# Altium footprint library ICs And Semiconductors SMD.PcbLib: 943 footprints (part 31 of 60)
Each footprint in its own frame and in the unit in brackets; x right, y up, seen from the top. Pads: shape width x height; smd on the part's side, far side on the other; paste and mask are expansions set on the pad; w line width, h text height; cw(c..) or ccw(c..) is an arc to the next point about the centre after c.
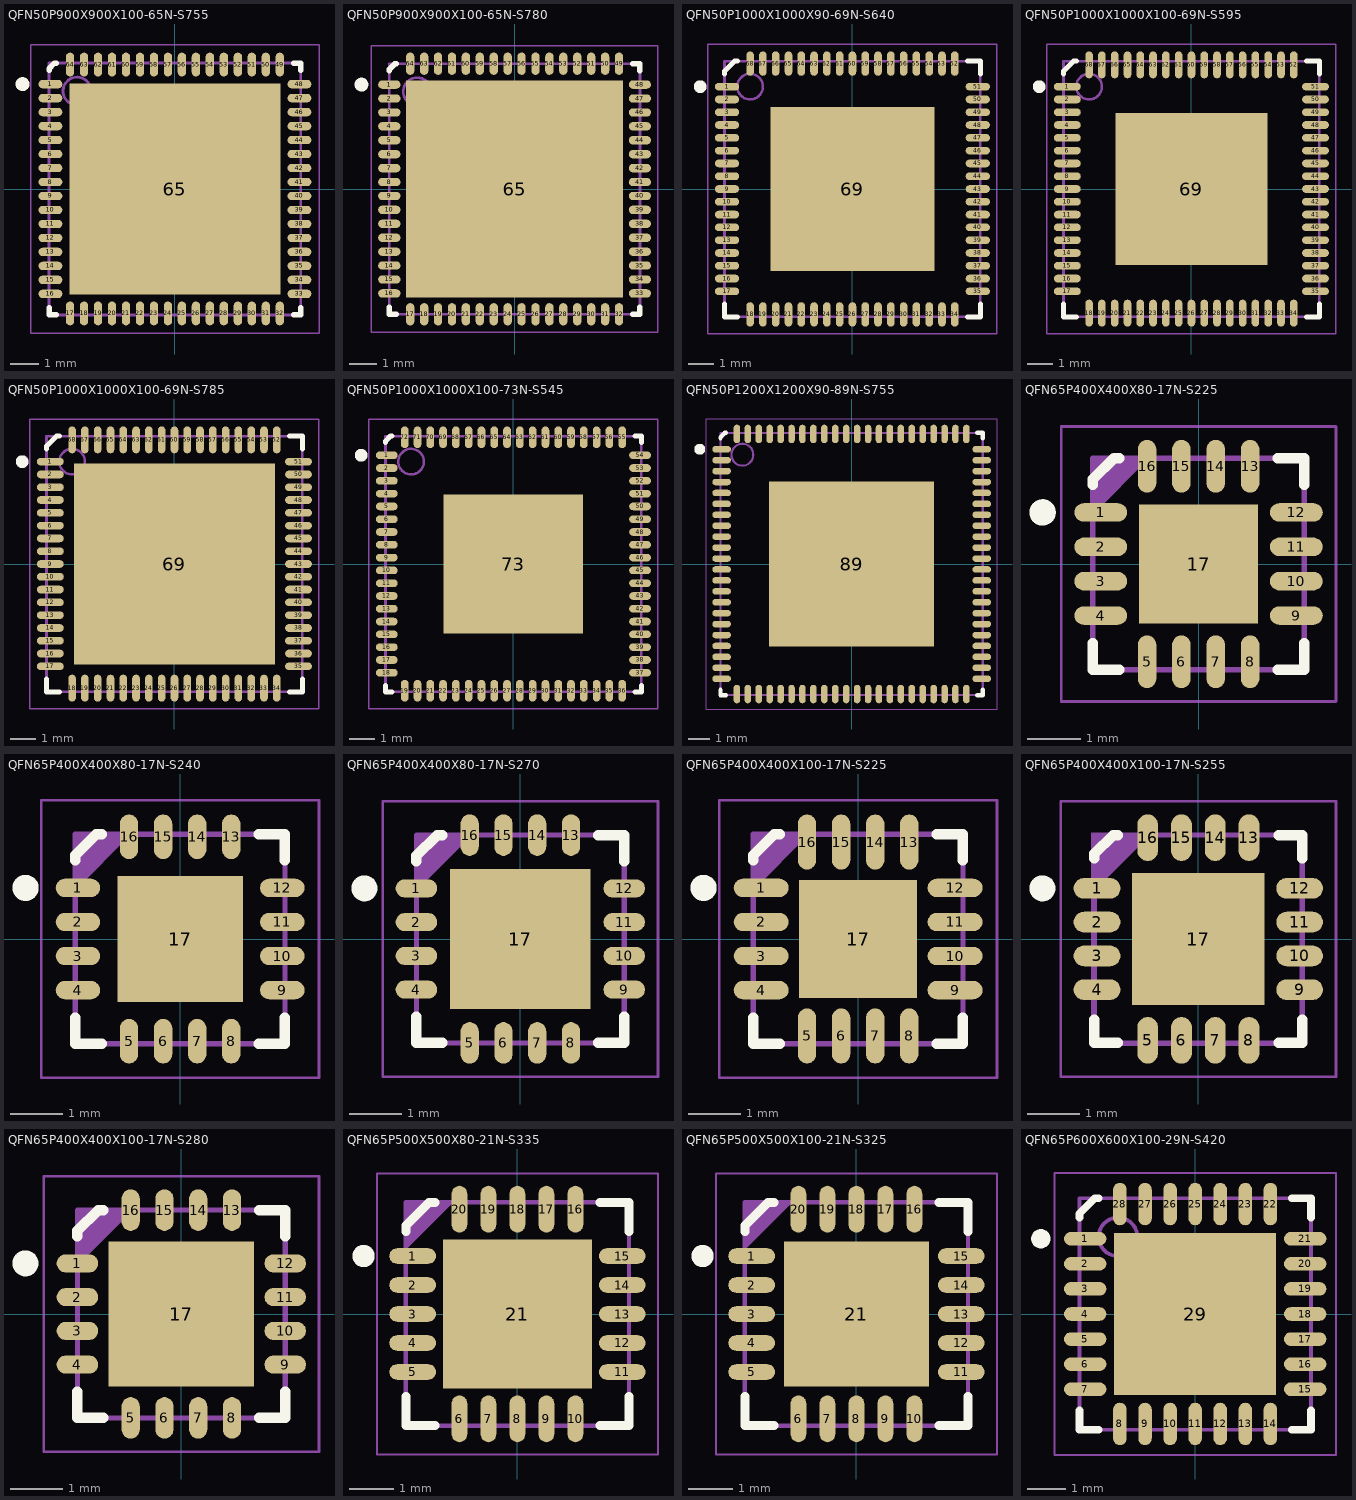
[diagram p30: the footprints below, top view; thin cyan lines are the x and y axes]

## QFN50P900X900X100-65N-S755 [mm] "QFN, 0.50mm Pitch, Square; 64 Pin, 9.00mm L X 9.00mm W X 1.00mm H Body (7.55 X 7.55mm Thermal Tab), IPC Medium Density"
height 1
pads (65):
  oval 0.85x0.3 smd: 1(-4.45,3.75) 2(-4.45,3.25) 3(-4.45,2.75) 4(-4.45,2.25) 5(-4.45,1.75) 6(-4.45,1.25) 7(-4.45,0.75) 8(-4.45,0.25) 9(-4.45,-0.25) 10(-4.45,-0.75) 11(-4.45,-1.25) 12(-4.45,-1.75) 13(-4.45,-2.25) 14(-4.45,-2.75) 15(-4.45,-3.25) 16(-4.45,-3.75) 33(4.45,-3.75) 34(4.45,-3.25) 35(4.45,-2.75) 36(4.45,-2.25) 37(4.45,-1.75) 38(4.45,-1.25) 39(4.45,-0.75) 40(4.45,-0.25) 41(4.45,0.25) 42(4.45,0.75) 43(4.45,1.25) 44(4.45,1.75) 45(4.45,2.25) 46(4.45,2.75) 47(4.45,3.25) 48(4.45,3.75)
  oval 0.3x0.85 smd: 17(-3.75,-4.45) 18(-3.25,-4.45) 19(-2.75,-4.45) 20(-2.25,-4.45) 21(-1.75,-4.45) 22(-1.25,-4.45) 23(-0.75,-4.45) 24(-0.25,-4.45) 25(0.25,-4.45) 26(0.75,-4.45) 27(1.25,-4.45) 28(1.75,-4.45) 29(2.25,-4.45) 30(2.75,-4.45) 31(3.25,-4.45) 32(3.75,-4.45) 49(3.75,4.45) 50(3.25,4.45) 51(2.75,4.45) 52(2.25,4.45) 53(1.75,4.45) 54(1.25,4.45) 55(0.75,4.45) 56(0.25,4.45) 57(-0.25,4.45) 58(-0.75,4.45) 59(-1.25,4.45) 60(-1.75,4.45) 61(-2.25,4.45) 62(-2.75,4.45) 63(-3.25,4.45) 64(-3.75,4.45)
  rect 7.55x7.55 smd: 65(0,0)
Top Overlay:
  circle w0.25: c-5.45,3.75 r0.125
  lines w0.2: -4.5,-4.25 -4.5,-4.5 -4.25,-4.5 ; -4.5,4.25 -4.5,4.3 -4.3,4.5 -4.25,4.5 ; 4.25,-4.5 4.5,-4.5 4.5,-4.25 ; 4.25,4.5 4.5,4.5 4.5,4.25
Top Paste:
  region: 1.5,1.5 1.5,3.1 3.1,3.1 3.1,1.5
  region: -0.8,1.5 -0.8,3.1 0.8,3.1 0.8,1.5
  region: -3.1,1.5 -3.1,3.1 -1.5,3.1 -1.5,1.5
  region: 1.5,-0.8 1.5,0.8 3.1,0.8 3.1,-0.8
  region: -0.8,-0.8 -0.8,0.8 0.8,0.8 0.8,-0.8
  region: -3.1,-0.8 -3.1,0.8 -1.5,0.8 -1.5,-0.8
  region: 1.5,-3.1 1.5,-1.5 3.1,-1.5 3.1,-3.1
  region: -0.8,-3.1 -0.8,-1.5 0.8,-1.5 0.8,-3.1
  region: -3.1,-3.1 -3.1,-1.5 -1.5,-1.5 -1.5,-3.1
Mechanical 14:
  circle w0.1: c-3.5,3.5 r0.5
  lines w0.1: -4.5,-4.5 4.5,-4.5 4.5,4.5 -4.5,4.5 -4.5,-4.5
Mechanical 15:
  circle w0.05: c0,0 r0.35
  lines w0.05: -0.5,0 0.5,0 ; 0,-0.5 0,0.5 ; -5.15,-5.15 5.15,-5.15 5.15,5.15 -5.15,5.15 -5.15,-5.15
3D body "QFN50P900X900X100-65N-S755.stp": height 1, standoff 0, extent -4.5,-4.5 4.5,4.5

## QFN50P900X900X100-65N-S780 [mm] "QFN, 0.50mm Pitch, Square; 64 Pin, 9.00mm L X 9.00mm W X 1.00mm H Body (7.8 X 7.8mm Thermal Tab), IPC Medium Density"
height 1
pads (65):
  oval 0.8x0.3 smd: 1(-4.5,3.75) 2(-4.5,3.25) 3(-4.5,2.75) 4(-4.5,2.25) 5(-4.5,1.75) 6(-4.5,1.25) 7(-4.5,0.75) 8(-4.5,0.25) 9(-4.5,-0.25) 10(-4.5,-0.75) 11(-4.5,-1.25) 12(-4.5,-1.75) 13(-4.5,-2.25) 14(-4.5,-2.75) 15(-4.5,-3.25) 16(-4.5,-3.75) 33(4.5,-3.75) 34(4.5,-3.25) 35(4.5,-2.75) 36(4.5,-2.25) 37(4.5,-1.75) 38(4.5,-1.25) 39(4.5,-0.75) 40(4.5,-0.25) 41(4.5,0.25) 42(4.5,0.75) 43(4.5,1.25) 44(4.5,1.75) 45(4.5,2.25) 46(4.5,2.75) 47(4.5,3.25) 48(4.5,3.75)
  oval 0.3x0.8 smd: 17(-3.75,-4.5) 18(-3.25,-4.5) 19(-2.75,-4.5) 20(-2.25,-4.5) 21(-1.75,-4.5) 22(-1.25,-4.5) 23(-0.75,-4.5) 24(-0.25,-4.5) 25(0.25,-4.5) 26(0.75,-4.5) 27(1.25,-4.5) 28(1.75,-4.5) 29(2.25,-4.5) 30(2.75,-4.5) 31(3.25,-4.5) 32(3.75,-4.5) 49(3.75,4.5) 50(3.25,4.5) 51(2.75,4.5) 52(2.25,4.5) 53(1.75,4.5) 54(1.25,4.5) 55(0.75,4.5) 56(0.25,4.5) 57(-0.25,4.5) 58(-0.75,4.5) 59(-1.25,4.5) 60(-1.75,4.5) 61(-2.25,4.5) 62(-2.75,4.5) 63(-3.25,4.5) 64(-3.75,4.5)
  rect 7.8x7.8 smd: 65(0,0)
Top Overlay:
  circle w0.25: c-5.5,3.75 r0.125
  lines w0.2: -4.5,-4.25 -4.5,-4.5 -4.25,-4.5 ; -4.5,4.25 -4.5,4.3 -4.3,4.5 -4.25,4.5 ; 4.25,-4.5 4.5,-4.5 4.5,-4.25 ; 4.25,4.5 4.5,4.5 4.5,4.25
Top Paste:
  region: -3.18,-3.18 -3.18,-1.54 -1.54,-1.54 -1.54,-3.18
  region: -0.82,-3.18 -0.82,-1.54 0.82,-1.54 0.82,-3.18
  region: 1.54,-3.18 1.54,-1.54 3.18,-1.54 3.18,-3.18
  region: -3.18,-0.82 -3.18,0.82 -1.54,0.82 -1.54,-0.82
  region: -0.82,-0.82 -0.82,0.82 0.82,0.82 0.82,-0.82
  region: 1.54,-0.82 1.54,0.82 3.18,0.82 3.18,-0.82
  region: -3.18,1.54 -3.18,3.18 -1.54,3.18 -1.54,1.54
  region: -0.82,1.54 -0.82,3.18 0.82,3.18 0.82,1.54
  region: 1.54,1.54 1.54,3.18 3.18,3.18 3.18,1.54
Mechanical 14:
  circle w0.1: c-3.5,3.5 r0.5
  lines w0.1: -4.5,-4.5 -4.5,4.5 4.5,4.5 4.5,-4.5 -4.5,-4.5
Mechanical 15:
  circle w0.05: c0,0 r0.35
  lines w0.05: -0.5,0 0.5,0 ; 0,-0.5 0,0.5 ; -5.15,-5.15 -5.15,5.15 5.15,5.15 5.15,-5.15 -5.15,-5.15
3D body "QFN50P900X900X100-65N-S780.stp": height 1, standoff 0, extent -4.5,-4.5 4.5,4.5

## QFN50P1000X1000X90-69N-S640 [mm] "QFP, 0.50mm Pitch, Square; 17 pin X 17 Pin, 10.00mm X 10.00mm (W/Thermal Tab 6.4mm X 6.4mm), IPC Medium Density"
height 0.9
pads (69):
  oval 0.95x0.3 smd: 1(-4.9,4) 2(-4.9,3.5) 3(-4.9,3) 4(-4.9,2.5) 5(-4.9,2) 6(-4.9,1.5) 7(-4.9,1) 8(-4.9,0.5) 9(-4.9,0) 10(-4.9,-0.5) 11(-4.9,-1) 12(-4.9,-1.5) 13(-4.9,-2) 14(-4.9,-2.5) 15(-4.9,-3) 16(-4.9,-3.5) 17(-4.9,-4) 35(4.9,-4) 36(4.9,-3.5) 37(4.9,-3) 38(4.9,-2.5) 39(4.9,-2) 40(4.9,-1.5) 41(4.9,-1) 42(4.9,-0.5) 43(4.9,0) 44(4.9,0.5) 45(4.9,1) 46(4.9,1.5) 47(4.9,2) 48(4.9,2.5) 49(4.9,3) 50(4.9,3.5) 51(4.9,4)
  oval 0.3x0.95 smd: 18(-4,-4.9) 19(-3.5,-4.9) 20(-3,-4.9) 21(-2.5,-4.9) 22(-2,-4.9) 23(-1.5,-4.9) 24(-1,-4.9) 25(-0.5,-4.9) 26(0,-4.9) 27(0.5,-4.9) 28(1,-4.9) 29(1.5,-4.9) 30(2,-4.9) 31(2.5,-4.9) 32(3,-4.9) 33(3.5,-4.9) 34(4,-4.9) 52(4,4.9) 53(3.5,4.9) 54(3,4.9) 55(2.5,4.9) 56(2,4.9) 57(1.5,4.9) 58(1,4.9) 59(0.5,4.9) 60(0,4.9) 61(-0.5,4.9) 62(-1,4.9) 63(-1.5,4.9) 64(-2,4.9) 65(-2.5,4.9) 66(-3,4.9) 67(-3.5,4.9) 68(-4,4.9)
  rect 6.4x6.4 smd: 69(0,0)
Top Overlay:
  circle w0.25: c-5.95,4 r0.125
  lines w0.2: -5,-4.5 -5,-5 -4.5,-5 ; -5,4.5 -5,4.6 -4.6,5 -4.5,5 ; 4.5,-5 5,-5 5,-4.5 ; 4.5,5 5,5 5,4.5
Top Paste:
  region: 0.39,0.39 0.39,2.41 2.41,2.41 2.41,0.39
  region: -2.41,0.39 -2.41,2.41 -0.39,2.41 -0.39,0.39
  region: 0.39,-2.41 0.39,-0.39 2.41,-0.39 2.41,-2.41
  region: -2.41,-2.41 -2.41,-0.39 -0.39,-0.39 -0.39,-2.41
Top Solder:
  circle w0.05: c0,0 r0.35
  lines w0.05: -0.5,0 0.5,0 ; 0,-0.5 0,0.5
Mechanical 14:
  circle w0.1: c-4,4 r0.5
  lines w0.1: -5,-5 5,-5 5,5 -5,5 -5,-5
Mechanical 15:
  lines w0.05: -5.65,-5.65 5.65,-5.65 5.65,5.65 -5.65,5.65 -5.65,-5.65
3D body "QFN50P1000X1000X90-69N-S640.stp": height 0.9, standoff 0, extent -5,-5 5,5

## QFN50P1000X1000X100-69N-S595 [mm] "QFP, 0.50mm Pitch, Square; 17 pin X 17 Pin, 10.00mm X 10.00mm (W/Thermal Tab 5.95mm X 5.95mm), IPC Medium Density"
height 1
pads (69):
  oval 1.05x0.3 smd: 1(-4.85,4) 2(-4.85,3.5) 3(-4.85,3) 4(-4.85,2.5) 5(-4.85,2) 6(-4.85,1.5) 7(-4.85,1) 8(-4.85,0.5) 9(-4.85,0) 10(-4.85,-0.5) 11(-4.85,-1) 12(-4.85,-1.5) 13(-4.85,-2) 14(-4.85,-2.5) 15(-4.85,-3) 16(-4.85,-3.5) 17(-4.85,-4) 35(4.85,-4) 36(4.85,-3.5) 37(4.85,-3) 38(4.85,-2.5) 39(4.85,-2) 40(4.85,-1.5) 41(4.85,-1) 42(4.85,-0.5) 43(4.85,0) 44(4.85,0.5) 45(4.85,1) 46(4.85,1.5) 47(4.85,2) 48(4.85,2.5) 49(4.85,3) 50(4.85,3.5) 51(4.85,4)
  oval 0.3x1.05 smd: 18(-4,-4.85) 19(-3.5,-4.85) 20(-3,-4.85) 21(-2.5,-4.85) 22(-2,-4.85) 23(-1.5,-4.85) 24(-1,-4.85) 25(-0.5,-4.85) 26(0,-4.85) 27(0.5,-4.85) 28(1,-4.85) 29(1.5,-4.85) 30(2,-4.85) 31(2.5,-4.85) 32(3,-4.85) 33(3.5,-4.85) 34(4,-4.85) 52(4,4.85) 53(3.5,4.85) 54(3,4.85) 55(2.5,4.85) 56(2,4.85) 57(1.5,4.85) 58(1,4.85) 59(0.5,4.85) 60(0,4.85) 61(-0.5,4.85) 62(-1,4.85) 63(-1.5,4.85) 64(-2,4.85) 65(-2.5,4.85) 66(-3,4.85) 67(-3.5,4.85) 68(-4,4.85)
  rect 5.95x5.95 smd: 69(0,0)
Top Overlay:
  circle w0.25: c-5.95,4 r0.125
  lines w0.2: -5,-4.5 -5,-5 -4.5,-5 ; -5,4.5 -5,4.6 -4.6,5 -4.5,5 ; 4.5,-5 5,-5 5,-4.5 ; 4.5,5 5,5 5,4.5
Top Paste:
  region: 0.36,0.36 0.36,2.24 2.24,2.24 2.24,0.36
  region: -2.24,0.36 -2.24,2.24 -0.36,2.24 -0.36,0.36
  region: 0.36,-2.24 0.36,-0.36 2.24,-0.36 2.24,-2.24
  region: -2.24,-2.24 -2.24,-0.36 -0.36,-0.36 -0.36,-2.24
Mechanical 14:
  circle w0.1: c-4,4 r0.5
  lines w0.1: -5,-5 -5,5 5,5 5,-5 -5,-5
Mechanical 15:
  lines w0.05: -5.65,-5.65 -5.65,5.65 5.65,5.65 5.65,-5.65 -5.65,-5.65
3D body "QFN50P1000X1000X100-69N-S595.stp": height 1, standoff 0, extent -5.05,-5.05 5.05,5.05

## QFN50P1000X1000X100-69N-S785 [mm] "QFP, 0.50mm pitch, square; 17 pin X 17 pin, 10.00mm X 10.00mm, IPC Medium Density"
height 1
pads (69):
  oval 1.05x0.3 smd: 1(-4.85,4) 2(-4.85,3.5) 3(-4.85,3) 4(-4.85,2.5) 5(-4.85,2) 6(-4.85,1.5) 7(-4.85,1) 8(-4.85,0.5) 9(-4.85,0) 10(-4.85,-0.5) 11(-4.85,-1) 12(-4.85,-1.5) 13(-4.85,-2) 14(-4.85,-2.5) 15(-4.85,-3) 16(-4.85,-3.5) 17(-4.85,-4) 35(4.85,-4) 36(4.85,-3.5) 37(4.85,-3) 38(4.85,-2.5) 39(4.85,-2) 40(4.85,-1.5) 41(4.85,-1) 42(4.85,-0.5) 43(4.85,0) 44(4.85,0.5) 45(4.85,1) 46(4.85,1.5) 47(4.85,2) 48(4.85,2.5) 49(4.85,3) 50(4.85,3.5) 51(4.85,4)
  oval 0.3x1.05 smd: 18(-4,-4.85) 19(-3.5,-4.85) 20(-3,-4.85) 21(-2.5,-4.85) 22(-2,-4.85) 23(-1.5,-4.85) 24(-1,-4.85) 25(-0.5,-4.85) 26(0,-4.85) 27(0.5,-4.85) 28(1,-4.85) 29(1.5,-4.85) 30(2,-4.85) 31(2.5,-4.85) 32(3,-4.85) 33(3.5,-4.85) 34(4,-4.85) 52(4,4.85) 53(3.5,4.85) 54(3,4.85) 55(2.5,4.85) 56(2,4.85) 57(1.5,4.85) 58(1,4.85) 59(0.5,4.85) 60(0,4.85) 61(-0.5,4.85) 62(-1,4.85) 63(-1.5,4.85) 64(-2,4.85) 65(-2.5,4.85) 66(-3,4.85) 67(-3.5,4.85) 68(-4,4.85)
  rect 7.85x7.85 smd: 69(0,0)
Top Overlay:
  circle w0.25: c-5.95,4 r0.125
  lines w0.2: -5,-4.5 -5,-5 -4.5,-5 ; -5,4.5 -5,4.6 -4.6,5 -4.5,5 ; 4.5,-5 5,-5 5,-4.5 ; 4.5,5 5,5 5,4.5
Top Paste:
  region: -3.21,-3.21 -3.21,-1.55 -1.55,-1.55 -1.55,-3.21
  region: -0.83,-3.21 -0.83,-1.55 0.83,-1.55 0.83,-3.21
  region: 1.55,-3.21 1.55,-1.55 3.21,-1.55 3.21,-3.21
  region: -3.21,-0.83 -3.21,0.83 -1.55,0.83 -1.55,-0.83
  region: -0.83,-0.83 -0.83,0.83 0.83,0.83 0.83,-0.83
  region: 1.55,-0.83 1.55,0.83 3.21,0.83 3.21,-0.83
  region: -3.21,1.55 -3.21,3.21 -1.55,3.21 -1.55,1.55
  region: -0.83,1.55 -0.83,3.21 0.83,3.21 0.83,1.55
  region: 1.55,1.55 1.55,3.21 3.21,3.21 3.21,1.55
Mechanical 14:
  circle w0.1: c-4,4 r0.5
  lines w0.1: -5,-5 -5,5 5,5 5,-5 -5,-5
Mechanical 15:
  lines w0.05: -0.5,0 0.5,0 ; 0,-0.5 0,0.5 ; -5.65,-5.65 -5.65,5.65 5.65,5.65 5.65,-5.65 -5.65,-5.65
3D body "QFN50P1000X1000X100-69N-S785.stp": height 1, standoff 0, extent -5.05,-5.05 5.05,5.05

## QFN50P1000X1000X100-73N-S545 [mm] "QFN,0.50mm Pitch, Square;72 Pin,10.00mm L X 10.00mm W X 1.00mm H Body (W/Thermal Tab 5.45mm X 5.45mm), IPC Medium Density"
height 1
pads (73):
  oval 0.85x0.3 smd: 1(-4.95,4.25) 2(-4.95,3.75) 3(-4.95,3.25) 4(-4.95,2.75) 5(-4.95,2.25) 6(-4.95,1.75) 7(-4.95,1.25) 8(-4.95,0.75) 9(-4.95,0.25) 10(-4.95,-0.25) 11(-4.95,-0.75) 12(-4.95,-1.25) 13(-4.95,-1.75) 14(-4.95,-2.25) 15(-4.95,-2.75) 16(-4.95,-3.25) 17(-4.95,-3.75) 18(-4.95,-4.25) 37(4.95,-4.25) 38(4.95,-3.75) 39(4.95,-3.25) 40(4.95,-2.75) 41(4.95,-2.25) 42(4.95,-1.75) 43(4.95,-1.25) 44(4.95,-0.75) 45(4.95,-0.25) 46(4.95,0.25) 47(4.95,0.75) 48(4.95,1.25) 49(4.95,1.75) 50(4.95,2.25) 51(4.95,2.75) 52(4.95,3.25) 53(4.95,3.75) 54(4.95,4.25)
  oval 0.3x0.85 smd: 19(-4.25,-4.95) 20(-3.75,-4.95) 21(-3.25,-4.95) 22(-2.75,-4.95) 23(-2.25,-4.95) 24(-1.75,-4.95) 25(-1.25,-4.95) 26(-0.75,-4.95) 27(-0.25,-4.95) 28(0.25,-4.95) 29(0.75,-4.95) 30(1.25,-4.95) 31(1.75,-4.95) 32(2.25,-4.95) 33(2.75,-4.95) 34(3.25,-4.95) 35(3.75,-4.95) 36(4.25,-4.95) 55(4.25,4.95) 56(3.75,4.95) 57(3.25,4.95) 58(2.75,4.95) 59(2.25,4.95) 60(1.75,4.95) 61(1.25,4.95) 62(0.75,4.95) 63(0.25,4.95) 64(-0.25,4.95) 65(-0.75,4.95) 66(-1.25,4.95) 67(-1.75,4.95) 68(-2.25,4.95) 69(-2.75,4.95) 70(-3.25,4.95) 71(-3.75,4.95) 72(-4.25,4.95)
  rect 5.45x5.45 smd: 73(0,0)
Top Overlay:
  circle w0.25: c-5.95,4.25 r0.125
  lines w0.2: -5,-4.75 -5,-5 -4.75,-5 ; -5,4.75 -5,4.8 -4.8,5 -4.75,5 ; 4.75,-5 5,-5 5,-4.75 ; 4.75,5 5,5 5,4.75
Top Paste:
  region: 0.33,0.33 0.33,2.05 2.05,2.05 2.05,0.33
  region: -2.05,0.33 -2.05,2.05 -0.33,2.05 -0.33,0.33
  region: 0.33,-2.05 0.33,-0.33 2.05,-0.33 2.05,-2.05
  region: -2.05,-2.05 -2.05,-0.33 -0.33,-0.33 -0.33,-2.05
Mechanical 14:
  circle w0.1: c-4,4 r0.5
  lines w0.1: -5,-5 5,-5 5,5 -5,5 -5,-5
Mechanical 15:
  lines w0.05: -5.65,-5.65 5.65,-5.65 5.65,5.65 -5.65,5.65 -5.65,-5.65
3D body "QFN50P1000X1000X100-73N-S545.stp": height 1, standoff -0.03, extent -5,-5 5,5

## QFN50P1200X1200X90-89N-S755 [mm] "QFN, 0.50mm pitch, square; 22 pin X 22 pin, 12.00mm X 12.00mm, IPC Medium Density"
height 0.9
pads (89):
  oval 0.85x0.3 smd: 1(-5.95,5.25) 2(-5.95,4.75) 3(-5.95,4.25) 4(-5.95,3.75) 5(-5.95,3.25) 6(-5.95,2.75) 7(-5.95,2.25) 8(-5.95,1.75) 9(-5.95,1.25) 10(-5.95,0.75) 11(-5.95,0.25) 12(-5.95,-0.25) 13(-5.95,-0.75) 14(-5.95,-1.25) 15(-5.95,-1.75) 16(-5.95,-2.25) 17(-5.95,-2.75) 18(-5.95,-3.25) 19(-5.95,-3.75) 20(-5.95,-4.25) 21(-5.95,-4.75) 22(-5.95,-5.25) 45(5.95,-5.25) 46(5.95,-4.75) 47(5.95,-4.25) 48(5.95,-3.75) 49(5.95,-3.25) 50(5.95,-2.75) 51(5.95,-2.25) 52(5.95,-1.75) 53(5.95,-1.25) 54(5.95,-0.75) 55(5.95,-0.25) 56(5.95,0.25) 57(5.95,0.75) 58(5.95,1.25) 59(5.95,1.75) 60(5.95,2.25) 61(5.95,2.75) 62(5.95,3.25) 63(5.95,3.75) 64(5.95,4.25) 65(5.95,4.75) 66(5.95,5.25)
  oval 0.3x0.85 smd: 23(-5.25,-5.95) 24(-4.75,-5.95) 25(-4.25,-5.95) 26(-3.75,-5.95) 27(-3.25,-5.95) 28(-2.75,-5.95) 29(-2.25,-5.95) 30(-1.75,-5.95) 31(-1.25,-5.95) 32(-0.75,-5.95) 33(-0.25,-5.95) 34(0.25,-5.95) 35(0.75,-5.95) 36(1.25,-5.95) 37(1.75,-5.95) 38(2.25,-5.95) 39(2.75,-5.95) 40(3.25,-5.95) 41(3.75,-5.95) 42(4.25,-5.95) 43(4.75,-5.95) 44(5.25,-5.95) 67(5.25,5.95) 68(4.75,5.95) 69(4.25,5.95) 70(3.75,5.95) 71(3.25,5.95) 72(2.75,5.95) 73(2.25,5.95) 74(1.75,5.95) 75(1.25,5.95) 76(0.75,5.95) 77(0.25,5.95) 78(-0.25,5.95) 79(-0.75,5.95) 80(-1.25,5.95) 81(-1.75,5.95) 82(-2.25,5.95) 83(-2.75,5.95) 84(-3.25,5.95) 85(-3.75,5.95) 86(-4.25,5.95) 87(-4.75,5.95) 88(-5.25,5.95)
  rect 7.55x7.55 smd: 89(0,0)
Top Overlay:
  circle w0.25: c-6.95,5.25 r0.125
  lines w0.2: -6,-5.75 -6,-6 -5.75,-6 ; -6,5.75 -6,5.8 -5.8,6 -5.75,6 ; 5.75,-6 6,-6 6,-5.75 ; 5.75,6 6,6 6,5.75
Top Paste:
  region: 1.5,1.5 1.5,3.1 3.1,3.1 3.1,1.5
  region: -0.8,1.5 -0.8,3.1 0.8,3.1 0.8,1.5
  region: -3.1,1.5 -3.1,3.1 -1.5,3.1 -1.5,1.5
  region: 1.5,-0.8 1.5,0.8 3.1,0.8 3.1,-0.8
  region: -0.8,-0.8 -0.8,0.8 0.8,0.8 0.8,-0.8
  region: -3.1,-0.8 -3.1,0.8 -1.5,0.8 -1.5,-0.8
  region: 1.5,-3.1 1.5,-1.5 3.1,-1.5 3.1,-3.1
  region: -0.8,-3.1 -0.8,-1.5 0.8,-1.5 0.8,-3.1
  region: -3.1,-3.1 -3.1,-1.5 -1.5,-1.5 -1.5,-3.1
Top Solder:
  circle w0.05: c0,0 r0.35
  lines w0.05: -0.5,0 0.5,0 ; 0,-0.5 0,0.5
Mechanical 14:
  circle w0.1: c-5,5 r0.5
  lines w0.1: -6,-6 6,-6 6,6 -6,6 -6,-6
Mechanical 15:
  circle w0.05: c0,0 r0.35
  lines w0.05: -0.5,0 0.5,0 ; 0,-0.5 0,0.5 ; -6.65,-6.65 6.65,-6.65 6.65,6.65 -6.65,6.65 -6.65,-6.65
3D body "QFN50P1200X1200X90-89N-S755.stp": height 0.9, standoff 0, extent -6.05,-6.05 6.05,6.05

## QFN65P400X400X80-17N-S225 [mm] "QFN, 0.65mm Pitch, Square; 16 Pin, 4.00mm L X 4.00mm W X 0.80mm H Body (w/Thermal tab 2.25 X 2.25mm),  IPC Medium Density"
height 0.8
pads (17):
  oval 1x0.35 smd: 1(-1.85,0.975) 2(-1.85,0.325) 3(-1.85,-0.325) 4(-1.85,-0.975) 9(1.85,-0.975) 10(1.85,-0.325) 11(1.85,0.325) 12(1.85,0.975)
  oval 0.35x1 smd: 5(-0.975,-1.85) 6(-0.325,-1.85) 7(0.325,-1.85) 8(0.975,-1.85) 13(0.975,1.85) 14(0.325,1.85) 15(-0.325,1.85) 16(-0.975,1.85)
  rect 2.25x2.25 smd: 17(0,0)
Top Overlay:
  circle w0.25: c-2.95,0.975 r0.125
  lines w0.2: -2,-1.5 -2,-2 -1.5,-2 ; -2,1.5 -2,1.6 -1.6,2 -1.5,2 ; 1.5,-2 2,-2 2,-1.5 ; 1.5,2 2,2 2,1.5
Mechanical 14:
  lines w0.1: -2,1 -1,2 ; -2,1.1 -1.1,2 ; -2,1.2 -1.2,2 ; -2,1.3 -1.3,2 ; -2,1.4 -1.4,2 ; -2,1.5 -1.5,2 ; -2,1.6 -1.6,2 ; -2,1.7 -1.7,2 ; -2,1.8 -1.8,2 ; -2,1.9 -1.9,2 ; -2,-2 -2,2 2,2 2,-2 -2,-2
Mechanical 15:
  circle w0.05: c0,0 r0.35
  lines w0.05: -0.5,0 0.5,0 ; 0,-0.5 0,0.5 ; -2.6,-2.6 -2.6,2.6 2.6,2.6 2.6,-2.6 -2.6,-2.6
3D body "QFN65P400X400X80-17N-S225.stp": height 0.8, standoff 0, extent -2,-2 2,2

## QFN65P400X400X80-17N-S240 [mm] "QFN, 0.65mm Pitch, Square; 16 Pin, 4.00mm L X 4.00mm W X 0.80mm H Body (w/Thermal tab 2.4 X 2.4mm),  IPC Medium Density"
height 0.8
pads (17):
  rrect100% 0.85x0.35 smd: 1(-1.95,0.975) 2(-1.95,0.325) 3(-1.95,-0.325) 4(-1.95,-0.975) 9(1.95,-0.975) 10(1.95,-0.325) 11(1.95,0.325) 12(1.95,0.975)
  rrect100% 0.35x0.85 smd: 5(-0.975,-1.95) 6(-0.325,-1.95) 7(0.325,-1.95) 8(0.975,-1.95) 13(0.975,1.95) 14(0.325,1.95) 15(-0.325,1.95) 16(-0.975,1.95)
  rect 2.4x2.4 smd: 17(0,0)
Top Overlay:
  circle w0.25: c-2.95,0.975 r0.125
  lines w0.2: -2,-1.5 -2,-2 -1.5,-2 ; -2,1.5 -2,1.6 -1.6,2 -1.5,2 ; 1.5,-2 2,-2 2,-1.5 ; 1.5,2 2,2 2,1.5
Mechanical 14:
  lines w0.1: -2,1 -1,2 ; -2,1.1 -1.1,2 ; -2,1.2 -1.2,2 ; -2,1.3 -1.3,2 ; -2,1.4 -1.4,2 ; -2,1.5 -1.5,2 ; -2,1.6 -1.6,2 ; -2,1.7 -1.7,2 ; -2,1.8 -1.8,2 ; -2,1.9 -1.9,2 ; -2,-2 2,-2 2,2 -2,2 -2,-2
Mechanical 15:
  circle w0.05: c0,0 r0.35
  lines w0.05: -0.5,0 0.5,0 ; 0,-0.5 0,0.5 ; -2.65,-2.65 2.65,-2.65 2.65,2.65 -2.65,2.65 -2.65,-2.65
3D body "QFN65P400X400X80-17N-S240.stp": height 0.8, standoff 0, extent -2,-2 2,2

## QFN65P400X400X80-17N-S270 [mm] "QFN, 0.65mm Pitch, Square; 16 Pin, 4.00mm L X 4.00mm W X 0.80mm H Body (w/thermal tab 2.7 X 2.7mm),  IPC Medium Density"
height 0.8
pads (17):
  oval 0.8x0.35 smd: 1(-2,0.975) 2(-2,0.325) 3(-2,-0.325) 4(-2,-0.975) 9(2,-0.975) 10(2,-0.325) 11(2,0.325) 12(2,0.975)
  oval 0.35x0.8 smd: 5(-0.975,-2) 6(-0.325,-2) 7(0.325,-2) 8(0.975,-2) 13(0.975,2) 14(0.325,2) 15(-0.325,2) 16(-0.975,2)
  rect 2.7x2.7 smd: 17(0,0)
Top Overlay:
  circle w0.25: c-3,0.975 r0.125
  lines w0.2: -2,-1.5 -2,-2 -1.5,-2 ; -2,1.5 -2,1.6 -1.6,2 -1.5,2 ; 1.5,-2 2,-2 2,-1.5 ; 1.5,2 2,2 2,1.5
Mechanical 14:
  lines w0.1: -2,1 -1,2 ; -2,1.1 -1.1,2 ; -2,1.2 -1.2,2 ; -2,1.3 -1.3,2 ; -2,1.4 -1.4,2 ; -2,1.5 -1.5,2 ; -2,1.6 -1.6,2 ; -2,1.7 -1.7,2 ; -2,1.8 -1.8,2 ; -2,1.9 -1.9,2 ; -2,-2 2,-2 2,2 -2,2 -2,-2
Mechanical 15:
  circle w0.05: c0,0 r0.35
  lines w0.05: -0.5,0 0.5,0 ; 0,-0.5 0,0.5 ; -2.65,-2.65 2.65,-2.65 2.65,2.65 -2.65,2.65 -2.65,-2.65
3D body "QFN65P400X400X80-17N-S270.stp": height 0.8, standoff 0, extent -2,-2 2,2

## QFN65P400X400X100-17N-S225 [mm] "QFN, 0.65mm pitch,square; 4 pin X 4 pin, 4mm X 4mm X 1mm H body (w/thermal tab 2.25 X 2.25mm),  IPC Medium Density"
height 1
pads (17):
  oval 1.05x0.35 smd: 1(-1.85,0.975) 2(-1.85,0.325) 3(-1.85,-0.325) 4(-1.85,-0.975) 9(1.85,-0.975) 10(1.85,-0.325) 11(1.85,0.325) 12(1.85,0.975)
  oval 0.35x1.05 smd: 5(-0.975,-1.85) 6(-0.325,-1.85) 7(0.325,-1.85) 8(0.975,-1.85) 13(0.975,1.85) 14(0.325,1.85) 15(-0.325,1.85) 16(-0.975,1.85)
  rect 2.25x2.25 smd: 17(0,0)
Top Overlay:
  circle w0.25: c-2.95,0.975 r0.125
  lines w0.2: -2,-1.5 -2,-2 -1.5,-2 ; -2,1.5 -2,1.6 -1.6,2 -1.5,2 ; 1.5,-2 2,-2 2,-1.5 ; 1.5,2 2,2 2,1.5
Mechanical 14:
  lines w0.1: -2,1 -1,2 ; -2,1.1 -1.1,2 ; -2,1.2 -1.2,2 ; -2,1.3 -1.3,2 ; -2,1.4 -1.4,2 ; -2,1.5 -1.5,2 ; -2,1.6 -1.6,2 ; -2,1.7 -1.7,2 ; -2,1.8 -1.8,2 ; -2,1.9 -1.9,2 ; -2,-2 2,-2 2,2 -2,2 -2,-2
Mechanical 15:
  lines w0.05: -0.5,0 0.5,0 ; 0,-0.5 0,0.5 ; -2.65,-2.65 2.65,-2.65 2.65,2.65 -2.65,2.65 -2.65,-2.65
3D body "QFN65P400X400X100-17N-S225.stp": height 1, standoff 0, extent -2,-2 2,2

## QFN65P400X400X100-17N-S255 [mm] "QFN, 0.65mm pitch,square; 4 pin X 4 pin, 4mm X 4mm X 1mm H body (w/thermal tab 2.55 X 2.55mm),  IPC Medium Density"
height 1
pads (17):
  oval 0.9x0.4 smd: 1(-1.95,0.975) 2(-1.95,0.325) 3(-1.95,-0.325) 4(-1.95,-0.975) 9(1.95,-0.975) 10(1.95,-0.325) 11(1.95,0.325) 12(1.95,0.975)
  oval 0.4x0.9 smd: 5(-0.975,-1.95) 6(-0.325,-1.95) 7(0.325,-1.95) 8(0.975,-1.95) 13(0.975,1.95) 14(0.325,1.95) 15(-0.325,1.95) 16(-0.975,1.95)
  rect 2.55x2.55 smd: 17(0,0)
Top Overlay:
  circle w0.25: c-3,0.975 r0.125
  lines w0.2: -2,-1.55 -2,-2 -1.55,-2 ; -2,1.55 -2,1.64 -1.64,2 -1.55,2 ; 1.55,-2 2,-2 2,-1.55 ; 1.55,2 2,2 2,1.55
Mechanical 8:
  lines w0.001: -2.05,-2.05 -2.05,2.05 2.05,2.05 2.05,-2.05 -2.05,-2.05
Mechanical 14:
  lines w0.1: -2,1 -1,2 ; -2,1.1 -1.1,2 ; -2,1.2 -1.2,2 ; -2,1.3 -1.3,2 ; -2,1.4 -1.4,2 ; -2,1.5 -1.5,2 ; -2,1.6 -1.6,2 ; -2,1.7 -1.7,2 ; -2,1.8 -1.8,2 ; -2,1.9 -1.9,2 ; -2,-2 -2,2 2,2 2,-2 -2,-2
Mechanical 15:
  circle w0.05: c0,0 r0.35
  lines w0.05: -0.5,0 0.5,0 ; 0,-0.5 0,0.5 ; -2.65,-2.65 -2.65,2.65 2.65,2.65 2.65,-2.65 -2.65,-2.65
3D body "QFN65P400X400X100-17N-S255.stp": height 1, standoff 0, extent -2,-2 2,2

## QFN65P400X400X100-17N-S280 [mm] "QFN, 0.65mm pitch,square; 4 pin X 4 pin, 4mm X 4mm X 1mm H body (w/thermal tab 2.8 X 2.8mm),  IPC Medium Density"
height 1
pads (17):
  oval 0.8x0.35 smd: 1(-2,0.975) 2(-2,0.325) 3(-2,-0.325) 4(-2,-0.975) 9(2,-0.975) 10(2,-0.325) 11(2,0.325) 12(2,0.975)
  oval 0.35x0.8 smd: 5(-0.975,-2) 6(-0.325,-2) 7(0.325,-2) 8(0.975,-2) 13(0.975,2) 14(0.325,2) 15(-0.325,2) 16(-0.975,2)
  rect 2.8x2.8 smd: 17(0,0)
Top Overlay:
  circle w0.25: c-3,0.975 r0.125
  lines w0.2: -2,-1.5 -2,-2 -1.5,-2 ; -2,1.5 -2,1.6 -1.6,2 -1.5,2 ; 1.5,-2 2,-2 2,-1.5 ; 1.5,2 2,2 2,1.5
Mechanical 14:
  lines w0.1: -2,1 -1,2 ; -2,1.1 -1.1,2 ; -2,1.2 -1.2,2 ; -2,1.3 -1.3,2 ; -2,1.4 -1.4,2 ; -2,1.5 -1.5,2 ; -2,1.6 -1.6,2 ; -2,1.7 -1.7,2 ; -2,1.8 -1.8,2 ; -2,1.9 -1.9,2 ; -2,-2 2,-2 2,2 -2,2 -2,-2
Mechanical 15:
  lines w0.05: -0.5,0 0.5,0 ; 0,-0.5 0,0.5 ; -2.65,-2.65 2.65,-2.65 2.65,2.65 -2.65,2.65 -2.65,-2.65
3D body "QFN65P400X400X100-17N-S280.stp": height 1, standoff 0, extent -2.075,-2.075 2.075,2.075

## QFN65P500X500X80-21N-S335 [mm] "QFN, 0.65mm pitch,square; 20 pin, 5mm X 5mm X 0.8mm H body (w/thermal tab 3.35 X 3.35mm),  IPC Medium Density"
height 0.8
pads (21):
  oval 1.05x0.35 smd: 1(-2.35,1.3) 2(-2.35,0.65) 3(-2.35,0) 4(-2.35,-0.65) 5(-2.35,-1.3) 11(2.35,-1.3) 12(2.35,-0.65) 13(2.35,0) 14(2.35,0.65) 15(2.35,1.3)
  oval 0.35x1.05 smd: 6(-1.3,-2.35) 7(-0.65,-2.35) 8(0,-2.35) 9(0.65,-2.35) 10(1.3,-2.35) 16(1.3,2.35) 17(0.65,2.35) 18(0,2.35) 19(-0.65,2.35) 20(-1.3,2.35)
  rect 3.35x3.35 smd: 21(0,0)
Top Overlay:
  circle w0.25: c-3.45,1.3 r0.125
  lines w0.2: -2.5,-1.85 -2.5,-2.5 -1.85,-2.5 ; -2.5,1.85 -2.5,1.98 -1.98,2.5 -1.85,2.5 ; 1.85,-2.5 2.5,-2.5 2.5,-1.85 ; 1.85,2.5 2.5,2.5 2.5,1.85
Mechanical 14:
  lines w0.1: -2.5,1.5 -1.5,2.5 ; -2.5,1.6 -1.6,2.5 ; -2.5,1.7 -1.7,2.5 ; -2.5,1.8 -1.8,2.5 ; -2.5,1.9 -1.9,2.5 ; -2.5,2 -2,2.5 ; -2.5,2.1 -2.1,2.5 ; -2.5,2.2 -2.2,2.5 ; -2.5,2.3 -2.3,2.5 ; -2.5,2.4 -2.4,2.5 ; -2.5,-2.5 2.5,-2.5 2.5,2.5 -2.5,2.5 -2.5,-2.5
Mechanical 15:
  lines w0.05: -0.5,0 0.5,0 ; 0,-0.5 0,0.5 ; -3.15,-3.15 3.15,-3.15 3.15,3.15 -3.15,3.15 -3.15,-3.15
3D body "QFN65P500X500X100-21N-S325.stp": height 1, standoff 0, extent -2.575,-2.575 2.575,2.575

## QFN65P500X500X100-21N-S325 [mm] "QFN, 0.65mm pitch,square; 20 pin, 5mm X 5mm X 1mm H body (w/thermal tab 3.25 X 3.25mm),  IPC Medium Density"
height 1
pads (21):
  oval 1.05x0.35 smd: 1(-2.35,1.3) 2(-2.35,0.65) 3(-2.35,0) 4(-2.35,-0.65) 5(-2.35,-1.3) 11(2.35,-1.3) 12(2.35,-0.65) 13(2.35,0) 14(2.35,0.65) 15(2.35,1.3)
  oval 0.35x1.05 smd: 6(-1.3,-2.35) 7(-0.65,-2.35) 8(0,-2.35) 9(0.65,-2.35) 10(1.3,-2.35) 16(1.3,2.35) 17(0.65,2.35) 18(0,2.35) 19(-0.65,2.35) 20(-1.3,2.35)
  rect 3.25x3.25 smd: 21(0,0)
Top Overlay:
  circle w0.25: c-3.45,1.3 r0.125
  lines w0.2: -2.5,-1.85 -2.5,-2.5 -1.85,-2.5 ; -2.5,1.85 -2.5,1.98 -1.98,2.5 -1.85,2.5 ; 1.85,-2.5 2.5,-2.5 2.5,-1.85 ; 1.85,2.5 2.5,2.5 2.5,1.85
Mechanical 14:
  lines w0.1: -2.5,1.5 -1.5,2.5 ; -2.5,1.6 -1.6,2.5 ; -2.5,1.7 -1.7,2.5 ; -2.5,1.8 -1.8,2.5 ; -2.5,1.9 -1.9,2.5 ; -2.5,2 -2,2.5 ; -2.5,2.1 -2.1,2.5 ; -2.5,2.2 -2.2,2.5 ; -2.5,2.3 -2.3,2.5 ; -2.5,2.4 -2.4,2.5 ; -2.5,-2.5 2.5,-2.5 2.5,2.5 -2.5,2.5 -2.5,-2.5
Mechanical 15:
  lines w0.05: -0.5,0 0.5,0 ; 0,-0.5 0,0.5 ; -3.15,-3.15 3.15,-3.15 3.15,3.15 -3.15,3.15 -3.15,-3.15
3D body "QFN65P500X500X100-21N-S325.stp": height 1, standoff 0, extent -2.575,-2.575 2.575,2.575

## QFN65P600X600X100-29N-S420 [mm] "QFN, 0.65mm pitch, square; 28 pin, 6.00mm L X 6.00mm W X 1.00mm H body (w/thermal tab 4.2mm x 4.2mm), IPC Medium Density"
height 1
pads (29):
  oval 1.1x0.35 smd: 1(-2.85,1.95) 2(-2.85,1.3) 3(-2.85,0.65) 4(-2.85,0) 5(-2.85,-0.65) 6(-2.85,-1.3) 7(-2.85,-1.95) 15(2.85,-1.95) 16(2.85,-1.3) 17(2.85,-0.65) 18(2.85,0) 19(2.85,0.65) 20(2.85,1.3) 21(2.85,1.95)
  oval 0.35x1.1 smd: 8(-1.95,-2.85) 9(-1.3,-2.85) 10(-0.65,-2.85) 11(0,-2.85) 12(0.65,-2.85) 13(1.3,-2.85) 14(1.95,-2.85) 22(1.95,2.85) 23(1.3,2.85) 24(0.65,2.85) 25(0,2.85) 26(-0.65,2.85) 27(-1.3,2.85) 28(-1.95,2.85)
  rect 4.2x4.2 smd: 29(0,0)
Top Overlay:
  circle w0.25: c-4,1.95 r0.125
  lines w0.2: -3,-2.5 -3,-3 -2.5,-3 ; -3,2.5 -3,2.6 -2.6,3 -2.5,3 ; 2.5,-3 3,-3 3,-2.5 ; 2.5,3 3,3 3,2.5
Mechanical 14:
  circle w0.1: c-2,2 r0.5
  lines w0.1: -3,-3 3,-3 3,3 -3,3 -3,-3
Mechanical 15:
  circle w0.05: c0,0 r0.35
  lines w0.05: -0.5,0 0.5,0 ; 0,-0.5 0,0.5 ; -3.65,-3.65 3.65,-3.65 3.65,3.65 -3.65,3.65 -3.65,-3.65
3D body "QFN65P600X600X100-29N-S420.stp": height 0.98, standoff -0.02, extent -3,-3 3,3